# Altium footprint library SAMTEC SMD.PcbLib: 165 footprints (part 17 of 17) (continued)
## SAMTEC_TFM-125-02-L-D-A [mm] "50 Contacts - Pitch 1.27mm - Dual Row Straight SMT Header" (continued)
Mechanical 15:
  lines w0.05: -17.713,-3.425 17.713,-3.425 17.713,3.425 -17.713,3.425 -17.713,-3.425
3D body "SAMTEC_TFM-125-02-L-D-A.stp": height 5.59, standoff -1.14, extent -17.465,-2.984 17.465,2.985

## SAMTEC_TMM-103-01-L-D-SM-P-TR [mm] "6 Contacts - Pitch 2mm - Dual Row Surface Mount Straight Strip Header with Pick & Place Pad"
height 8.1
pads (6):
  rect 1.02x3.215 smd: 1(-2,-2.135) 2(-2,2.22) 3(0,-2.135) 4(0,2.22) 5(2,-2.135) 6(2,2.22)
Top Overlay:
  circle w0.25: c-1.998,-4.285 r0.125
  circle w0.25: c-1.998,-4.285 r0.125
  lines w0.2: -2.81,-1.65 -3,-1.65 -3,-0.412 -2.809,-0.412 -2.809,0.35 -3,0.35 -3,1.587 -2.81,1.587 ; -1.19,-1.65 -0.81,-1.65 ; -1.19,1.587 -0.81,1.587 ; 0.81,-1.65 1.19,-1.65 ; 0.81,1.587 1.19,1.587 ; 2.81,-1.65 3,-1.65 3,1.587 2.81,1.587
Mechanical 8:
  lines w0.1: -2.51,-3.743 -2.51,-0.528 ; -2.51,0.613 -2.51,3.828 ; -2.5,-2.135 -2,-2.135 ; -2.5,2.135 -2,2.135 ; -2,-2.635 -2,-2.135 ; -2,-1.635 -2,-2.135 ; -2,1.635 -2,2.135 ; -2,2.635 -2,2.135 ; -1.5,-2.135 -2,-2.135 ; -1.5,2.135 -2,2.135 ; -1.49,-3.743 -1.49,-0.528 ; -1.49,0.613 -1.49,3.828 ; -0.51,-3.743 -0.51,-0.528 ; -0.51,0.613 -0.51,3.828 ; -0.5,-2.135 0,-2.135 ; -0.5,0 0,0 ; -0.5,2.135 0,2.135 ; 0,-2.635 0,-2.135 ; 0,-1.635 0,-2.135 ; 0,-0.5 0,0 ; 0,0.5 0,0 ; 0,1.635 0,2.135 ; 0,2.635 0,2.135 ; 0.5,-2.135 0,-2.135 ; 0.5,0 0,0 ; 0.5,2.135 0,2.135 ; 0.51,-3.743 0.51,-0.528 ; 0.51,0.613 0.51,3.828 ; 1.49,-3.743 1.49,-0.528 ; 1.49,0.613 1.49,3.828 ; 1.5,-2.135 2,-2.135 ; 1.5,2.135 2,2.135 ; 2,-2.635 2,-2.135 ; 2,-1.635 2,-2.135 ; 2,1.635 2,2.135 ; 2,2.635 2,2.135 ; 2.5,-2.135 2,-2.135 ; 2.5,2.135 2,2.135 ; 2.51,-3.743 2.51,-0.528 ; 2.51,0.613 2.51,3.828 ; -2.51,-3.785 -1.49,-3.785 -1.49,-0.485 -2.51,-0.485 -2.51,-3.785 ; -2.51,0.485 -1.49,0.485 -1.49,3.785 -2.51,3.785 -2.51,0.485 ; -0.51,-3.785 0.51,-3.785 0.51,-0.485 -0.51,-0.485 -0.51,-3.785 ; -0.51,0.485 -0.51,3.785 0.51,3.785 0.51,0.485 -0.51,0.485 ; 1.49,-3.785 1.49,-0.485 2.51,-0.485 2.51,-3.785 1.49,-3.785 ; 1.49,0.485 1.49,3.785 2.51,3.785 2.51,0.485 1.49,0.485
Mechanical 14:
  circle w0.1: c-2,-4.285 r0.25
  lines w0.1: -2.254,-1.968 -2.254,-3.303 -1.746,-3.303 -1.746,-1.968 ; -2.254,1.968 -2.254,3.303 -1.746,3.303 -1.746,1.968 ; -0.254,-1.968 -0.254,-3.303 0.254,-3.303 0.254,-1.968 ; -0.254,1.968 -0.254,3.303 0.254,3.303 0.254,1.968 ; 1.746,-1.968 1.746,-3.303 2.254,-3.303 2.254,-1.968 ; 1.746,1.968 1.746,3.303 2.254,3.303 2.254,1.968 ; -2.254,-1.254 -2.254,-0.746 ; -2.254,-1.254 -1.746,-1.254 ; -2.254,-1.254 -2.127,-1.127 ; -2.254,-0.746 -2.127,-0.873 ; -2.254,-0.746 -1.746,-0.746 ; -2.254,0.746 -2.127,0.873 ; -2.254,0.746 -2.254,1.254 ; -2.254,0.746 -1.746,0.746 ; -2.254,1.254 -2.127,1.127 ; -2.254,1.254 -1.746,1.254 ; -2.127,-1.127 -2.127,-0.873 ; -2.127,-1.127 -1.873,-1.127 ; -2.127,-0.873 -1.873,-0.873 ; -2.127,0.873 -2.127,1.127 ; -2.127,0.873 -1.873,0.873 ; -2.127,1.127 -1.873,1.127 ; -1.873,-1.127 -1.746,-1.254 ; -1.873,-1.127 -1.873,-0.873 ; -1.873,-0.873 -1.746,-0.746 ; -1.873,0.873 -1.746,0.746 ; -1.873,0.873 -1.873,1.127 ; -1.873,1.127 -1.746,1.254 ; -1.746,-1.254 -1.746,-0.746 ; -1.746,0.746 -1.746,1.254 ; -0.254,-1.254 -0.254,-0.746 ; -0.254,-1.254 0.254,-1.254 ; -0.254,-1.254 -0.127,-1.127 ; -0.254,-0.746 -0.127,-0.873 ; -0.254,-0.746 0.254,-0.746 ; -0.254,0.746 -0.127,0.873 ; -0.254,0.746 -0.254,1.254 ; -0.254,0.746 0.254,0.746 ; -0.254,1.254 -0.127,1.127 ; -0.254,1.254 0.254,1.254 ; -0.127,-1.127 -0.127,-0.873 ; -0.127,-1.127 0.127,-1.127 ; -0.127,-0.873 0.127,-0.873 ; -0.127,0.873 -0.127,1.127 ; -0.127,0.873 0.127,0.873 ; -0.127,1.127 0.127,1.127 ; 0.127,-1.127 0.254,-1.254 ; 0.127,-1.127 0.127,-0.873 ; 0.127,-0.873 0.254,-0.746 ; 0.127,0.873 0.254,0.746 ; 0.127,0.873 0.127,1.127 ; 0.127,1.127 0.254,1.254 ; 0.254,-1.254 0.254,-0.746 ; 0.254,0.746 0.254,1.254 ; 1.746,-1.254 1.746,-0.746 ; 1.746,-1.254 2.254,-1.254 ; 1.746,-1.254 1.873,-1.127 ; 1.746,-0.746 1.873,-0.873 ; 1.746,-0.746 2.254,-0.746 ; 1.746,0.746 1.873,0.873 ; 1.746,0.746 1.746,1.254 ; 1.746,0.746 2.254,0.746 ; 1.746,1.254 1.873,1.127 ; 1.746,1.254 2.254,1.254 ; 1.873,-1.127 1.873,-0.873 ; 1.873,-1.127 2.127,-1.127 ; 1.873,-0.873 2.127,-0.873 ; 1.873,0.873 1.873,1.127 ; 1.873,0.873 2.127,0.873 ; 1.873,1.127 2.127,1.127 ; 2.127,-1.127 2.254,-1.254 ; 2.127,-1.127 2.127,-0.873 ; 2.127,-0.873 2.254,-0.746 ; 2.127,0.873 2.254,0.746 ; 2.127,0.873 2.127,1.127 ; 2.127,1.127 2.254,1.254 ; 2.254,-1.254 2.254,-0.746 ; 2.254,0.746 2.254,1.254 ; -3,-1.587 -3,1.65 -2.809,1.65 -2.809,1.968 -1.19,1.968 -1.19,1.65 -0.809,1.65 -0.809,1.968 0.809,1.968 0.809,1.65 1.19,1.65 1.19,1.968 2.809,1.968 2.809,1.65 3,1.65 3,0.412 2.809,0.412 2.809,-0.35 3,-0.35 3,-1.587 2.809,-1.587 2.809,-1.968 1.19,-1.968 1.19,-1.587 0.809,-1.587 0.809,-1.968 -0.809,-1.968 -0.809,-1.587 -1.19,-1.587 -1.19,-1.968 -2.809,-1.968 -2.809,-1.587 -3,-1.587
Mechanical 15:
  lines w0.1: -4.25,-4.035 -4.25,4.035 4.251,4.035 4.251,-4.035 -4.25,-4.035
3D body "SAMTEC_TMM-103-01-L-D-SM-P-TR_Part2.stp": height 8.1, standoff 2.76, extent -4,-2.54 4.001,2.54
3D body "SAMTEC_TMM-103-01-L-D-SM-P-TR_Part1.stp": height 5.97, standoff 0, extent -3,-3.302 3,3.303

## SAMTEC_TMM-103-01-L-D-SM-TR [mm] "6 Contacts - Pitch 2mm - Dual Row Surface Mount Straight Strip Header"
height 5.97
pads (6):
  rect 1.02x3.215 smd: 1(-2,-2.135) 2(-2,2.22) 3(0,-2.135) 4(0,2.22) 5(2,-2.135) 6(2,2.22)
Top Overlay:
  circle w0.25: c-1.998,-4.285 r0.125
  circle w0.25: c-1.998,-4.285 r0.125
  lines w0.2: -2.81,-1.65 -3,-1.65 -3,-0.412 -2.809,-0.412 -2.809,0.35 -3,0.35 -3,1.587 -2.81,1.587 ; -1.19,-1.65 -0.81,-1.65 ; -1.19,1.587 -0.81,1.587 ; 0.81,-1.65 1.19,-1.65 ; 0.81,1.587 1.19,1.587 ; 2.81,-1.65 3,-1.65 3,1.587 2.81,1.587
Mechanical 8:
  lines w0.1: -2.51,-3.743 -2.51,-0.528 ; -2.51,0.613 -2.51,3.828 ; -2.5,-2.135 -2,-2.135 ; -2.5,2.135 -2,2.135 ; -2,-2.635 -2,-2.135 ; -2,-1.635 -2,-2.135 ; -2,1.635 -2,2.135 ; -2,2.635 -2,2.135 ; -1.5,-2.135 -2,-2.135 ; -1.5,2.135 -2,2.135 ; -1.49,-3.743 -1.49,-0.528 ; -1.49,0.613 -1.49,3.828 ; -0.51,-3.743 -0.51,-0.528 ; -0.51,0.613 -0.51,3.828 ; -0.5,-2.135 0,-2.135 ; -0.5,0 0,0 ; -0.5,2.135 0,2.135 ; 0,-2.635 0,-2.135 ; 0,-1.635 0,-2.135 ; 0,-0.5 0,0 ; 0,0.5 0,0 ; 0,1.635 0,2.135 ; 0,2.635 0,2.135 ; 0.5,-2.135 0,-2.135 ; 0.5,0 0,0 ; 0.5,2.135 0,2.135 ; 0.51,-3.743 0.51,-0.528 ; 0.51,0.613 0.51,3.828 ; 1.49,-3.743 1.49,-0.528 ; 1.49,0.613 1.49,3.828 ; 1.5,-2.135 2,-2.135 ; 1.5,2.135 2,2.135 ; 2,-2.635 2,-2.135 ; 2,-1.635 2,-2.135 ; 2,1.635 2,2.135 ; 2,2.635 2,2.135 ; 2.5,-2.135 2,-2.135 ; 2.5,2.135 2,2.135 ; 2.51,-3.743 2.51,-0.528 ; 2.51,0.613 2.51,3.828 ; -2.51,-3.785 -1.49,-3.785 -1.49,-0.485 -2.51,-0.485 -2.51,-3.785 ; -2.51,0.485 -1.49,0.485 -1.49,3.785 -2.51,3.785 -2.51,0.485 ; -0.51,-3.785 0.51,-3.785 0.51,-0.485 -0.51,-0.485 -0.51,-3.785 ; -0.51,0.485 -0.51,3.785 0.51,3.785 0.51,0.485 -0.51,0.485 ; 1.49,-3.785 1.49,-0.485 2.51,-0.485 2.51,-3.785 1.49,-3.785 ; 1.49,0.485 1.49,3.785 2.51,3.785 2.51,0.485 1.49,0.485
Mechanical 14:
  circle w0.1: c-2,-4.285 r0.25
  lines w0.1: -2.254,-1.968 -2.254,-3.303 -1.746,-3.303 -1.746,-1.968 ; -2.254,1.968 -2.254,3.303 -1.746,3.303 -1.746,1.968 ; -0.254,-1.968 -0.254,-3.303 0.254,-3.303 0.254,-1.968 ; -0.254,1.968 -0.254,3.303 0.254,3.303 0.254,1.968 ; 1.746,-1.968 1.746,-3.303 2.254,-3.303 2.254,-1.968 ; 1.746,1.968 1.746,3.303 2.254,3.303 2.254,1.968 ; -2.254,-1.254 -2.254,-0.746 ; -2.254,-1.254 -1.746,-1.254 ; -2.254,-1.254 -2.127,-1.127 ; -2.254,-0.746 -2.127,-0.873 ; -2.254,-0.746 -1.746,-0.746 ; -2.254,0.746 -2.127,0.873 ; -2.254,0.746 -2.254,1.254 ; -2.254,0.746 -1.746,0.746 ; -2.254,1.254 -2.127,1.127 ; -2.254,1.254 -1.746,1.254 ; -2.127,-1.127 -2.127,-0.873 ; -2.127,-1.127 -1.873,-1.127 ; -2.127,-0.873 -1.873,-0.873 ; -2.127,0.873 -2.127,1.127 ; -2.127,0.873 -1.873,0.873 ; -2.127,1.127 -1.873,1.127 ; -1.873,-1.127 -1.746,-1.254 ; -1.873,-1.127 -1.873,-0.873 ; -1.873,-0.873 -1.746,-0.746 ; -1.873,0.873 -1.746,0.746 ; -1.873,0.873 -1.873,1.127 ; -1.873,1.127 -1.746,1.254 ; -1.746,-1.254 -1.746,-0.746 ; -1.746,0.746 -1.746,1.254 ; -0.254,-1.254 -0.254,-0.746 ; -0.254,-1.254 0.254,-1.254 ; -0.254,-1.254 -0.127,-1.127 ; -0.254,-0.746 -0.127,-0.873 ; -0.254,-0.746 0.254,-0.746 ; -0.254,0.746 -0.127,0.873 ; -0.254,0.746 -0.254,1.254 ; -0.254,0.746 0.254,0.746 ; -0.254,1.254 -0.127,1.127 ; -0.254,1.254 0.254,1.254 ; -0.127,-1.127 -0.127,-0.873 ; -0.127,-1.127 0.127,-1.127 ; -0.127,-0.873 0.127,-0.873 ; -0.127,0.873 -0.127,1.127 ; -0.127,0.873 0.127,0.873 ; -0.127,1.127 0.127,1.127 ; 0.127,-1.127 0.254,-1.254 ; 0.127,-1.127 0.127,-0.873 ; 0.127,-0.873 0.254,-0.746 ; 0.127,0.873 0.254,0.746 ; 0.127,0.873 0.127,1.127 ; 0.127,1.127 0.254,1.254 ; 0.254,-1.254 0.254,-0.746 ; 0.254,0.746 0.254,1.254 ; 1.746,-1.254 1.746,-0.746 ; 1.746,-1.254 2.254,-1.254 ; 1.746,-1.254 1.873,-1.127 ; 1.746,-0.746 1.873,-0.873 ; 1.746,-0.746 2.254,-0.746 ; 1.746,0.746 1.873,0.873 ; 1.746,0.746 1.746,1.254 ; 1.746,0.746 2.254,0.746 ; 1.746,1.254 1.873,1.127 ; 1.746,1.254 2.254,1.254 ; 1.873,-1.127 1.873,-0.873 ; 1.873,-1.127 2.127,-1.127 ; 1.873,-0.873 2.127,-0.873 ; 1.873,0.873 1.873,1.127 ; 1.873,0.873 2.127,0.873 ; 1.873,1.127 2.127,1.127 ; 2.127,-1.127 2.254,-1.254 ; 2.127,-1.127 2.127,-0.873 ; 2.127,-0.873 2.254,-0.746 ; 2.127,0.873 2.254,0.746 ; 2.127,0.873 2.127,1.127 ; 2.127,1.127 2.254,1.254 ; 2.254,-1.254 2.254,-0.746 ; 2.254,0.746 2.254,1.254 ; -3,-1.587 -3,1.65 -2.809,1.65 -2.809,1.968 -1.19,1.968 -1.19,1.65 -0.809,1.65 -0.809,1.968 0.809,1.968 0.809,1.65 1.19,1.65 1.19,1.968 2.809,1.968 2.809,1.65 3,1.65 3,0.412 2.809,0.412 2.809,-0.35 3,-0.35 3,-1.587 2.809,-1.587 2.809,-1.968 1.19,-1.968 1.19,-1.587 0.809,-1.587 0.809,-1.968 -0.809,-1.968 -0.809,-1.587 -1.19,-1.587 -1.19,-1.968 -2.809,-1.968 -2.809,-1.587 -3,-1.587
Mechanical 15:
  lines w0.05: -3.25,-4.035 -3.25,4.035 3.25,4.035 3.25,-4.035 -3.25,-4.035
3D body "SAMTEC_TMM-103-01-L-D-SM-TR.stp": height 5.97, standoff 0, extent -3,-3.302 3,3.303

## SAMTEC_TMM-110-01-G-D-SM-A [mm] "20 Contacts - Pitch 2mm - Dual Row Surface Mount Straight Strip Header With Alignment Pin"
height 5.97
pads (22):
  rect 1.02x3.215 smd: 1(-9,-2.178) 2(-9,2.178) 3(-7,-2.178) 4(-7,2.178) 5(-5,-2.178) 6(-5,2.178) 7(-3,-2.178) 8(-3,2.178) 9(-1,-2.178) 10(-1,2.178) 11(1,-2.178) 12(1,2.178) 13(3,-2.178) 14(3,2.178) 15(5,-2.178) 16(5,2.178) 17(7,-2.178) 18(7,2.178) 19(9,-2.178) 20(9,2.178)
  round 0.5 hole 1.2 unplated mask+0.35: 21(-8,0) 22(8,0)
Top Overlay:
  circle w0.25: c-8.998,-4.327 r0.125
  circle w0.25: c-8.998,-4.327 r0.125
  lines w0.2: -10,-1.969 -10,1.969 ; 10,-1.969 10,1.969
  text "20" at 10.95,2.453 h1
Mechanical 8:
  drawing of 172 lines, arcs and shapes, not listed
Mechanical 14:
  drawing of 379 lines, arcs and shapes, not listed
  text "20" at 10.95,2.453 h1
Mechanical 15:
  lines w0.1: -10.25,-4.035 -10.25,4.035 10.25,4.035 10.25,-4.035 -10.25,-4.035
3D body "SAMTEC_TMM-110-01-G-D-SM-A.stp": height 5.97, standoff -1.02, extent -10,-3.274 10,3.274

## SAMTEC_TMM-110-01-L-D-SM-A [mm] "20 Contacts - Pitch 2mm - Dual Row Surface Mount Straight Strip Header With Alignment Pin"
height 5.97
pads (22):
  rect 1.02x3.215 smd: 1(-9,-2.178) 2(-9,2.178) 3(-7,-2.178) 4(-7,2.178) 5(-5,-2.178) 6(-5,2.178) 7(-3,-2.178) 8(-3,2.178) 9(-1,-2.178) 10(-1,2.178) 11(1,-2.178) 12(1,2.178) 13(3,-2.178) 14(3,2.178) 15(5,-2.178) 16(5,2.178) 17(7,-2.178) 18(7,2.178) 19(9,-2.178) 20(9,2.178)
  round 0.5 hole 1.2 unplated mask+0.35: 21(-8,0) 22(8,0)
Top Overlay:
  circle w0.25: c-8.998,-4.327 r0.125
  circle w0.25: c-8.998,-4.327 r0.125
  lines w0.2: -10,-1.969 -10,1.969 ; 10,-1.969 10,1.969
  text "20" at 10.95,2.453 h1
Mechanical 8:
  drawing of 172 lines, arcs and shapes, not listed
Mechanical 14:
  drawing of 379 lines, arcs and shapes, not listed
  text "20" at 10.95,2.453 h1
Mechanical 15:
  lines w0.1: -10.25,-4.035 10.25,-4.035 10.25,4.035 -10.25,4.035 -10.25,-4.035
3D body "SAMTEC_TMM-110-01-L-D-SM-A.stp": height 5.97, standoff -1.02, extent -10,-3.274 10,3.274

## SAMTEC_TMM-112-01-L-D-SM-A [mm] "24 Contacts - Pitch 2mm - Top Entry, Dual Row Surface Mount Header"
height 5.97
pads (26):
  rect 1x3.3 smd: 1(-11,-2.178) 2(-11,2.123) 3(-9,-2.178) 4(-9,2.123) 5(-7,-2.178) 6(-7,2.123) 7(-5,-2.178) 8(-5,2.123) 9(-3,-2.178) 10(-3,2.123) 11(-1,-2.178) 12(-1,2.123) 13(1,-2.178) 14(1,2.123) 15(3,-2.178) 16(3,2.123) 17(5,-2.178) 18(5,2.123) 19(7,-2.178) 20(7,2.123) 21(9,-2.178) 22(9,2.123) 23(11,-2.178) 24(11,2.123)
  round 0.5 hole 1.2 unplated mask+0.35: 25(-10,0) 26(10,0)
Top Overlay:
  circle w0.25: c-10.998,-4.327 r0.125
  circle w0.25: c-10.998,-4.327 r0.125
  lines w0.2: -11.8,-1.996 -12,-1.996 -12,1.941 -11.8,1.941 ; 11.8,-1.996 12,-1.996 12,1.941 11.8,1.941
  text "24" at 12.9,2.173 h1
Mechanical 8:
  drawing of 300 lines, arcs and shapes, not listed
Mechanical 14:
  drawing of 455 lines, arcs and shapes, not listed
  text "24" at 12.9,2.173 h1
Mechanical 15:
  lines w0.1: -12.25,-4.035 -12.25,4.035 12.25,4.035 12.25,-4.035 -12.25,-4.035
3D body "SAMTEC_TMM-112-01-G-D-SM-A.stp": height 5.97, standoff -1.02, extent -12,-3.274 12,3.274

## SAMTEC_TMM-120-01-L-D-SM [mm] "40 Contacts - Pitch 2mm - Top Entry, Dual Row Surface Mount Header"
height 5.97
pads (40):
  rect 1x3.3 smd: 1(-19,-2.15) 2(-19,2.15) 3(-17,-2.15) 4(-17,2.15) 5(-15,-2.15) 6(-15,2.15) 7(-13,-2.15) 8(-13,2.15) 9(-11,-2.15) 10(-11,2.15) 11(-9,-2.15) 12(-9,2.15) 13(-7,-2.15) 14(-7,2.15) 15(-5,-2.15) 16(-5,2.15) 17(-3,-2.15) 18(-3,2.15) 19(-1,-2.15) 20(-1,2.15) 21(1,-2.15) 22(1,2.15) 23(3,-2.15) 24(3,2.15) 25(5,-2.15) 26(5,2.15) 27(7,-2.15) 28(7,2.15) 29(9,-2.15) 30(9,2.15) 31(11,-2.15) 32(11,2.15) 33(13,-2.15) 34(13,2.15) 35(15,-2.15) 36(15,2.15) 37(17,-2.15) 38(17,2.15) 39(19,-2.15) 40(19,2.15)
Top Overlay:
  circle w0.25: c-18.998,-4.3 r0.125
  circle w0.25: c-18.998,-4.3 r0.125
  lines w0.2: -19.8,-1.969 -20,-1.969 -20,1.969 -19.8,1.969 ; 19.8,-1.969 20,-1.969 20,1.969 19.8,1.969
  text "40" at 20.9,2.2 h1
Mechanical 8:
  drawing of 324 lines, arcs and shapes, not listed
Mechanical 14:
  drawing of 637 lines, arcs and shapes, not listed
  text "40" at 20.9,2.2 h1
Mechanical 15:
  lines w0.1: -20.25,-4.05 -20.25,4.05 20.25,4.05 20.25,-4.05 -20.25,-4.05
3D body "SAMTEC_TMM-120-01-L-D-SM.stp": height 5.97, standoff 0, extent -20,-3.275 20,3.275

## SAMTEC_UCC8-010-1-H-S-1-A [mm] "10 Contacts - Pitch 0.8mm - Rugged Micro Flyover Socket System"
height 3.95
pads (14):
  rect 0.5x1.14 smd: 1(-3.6,0.094) 2(-2.8,0.094) 3(-2,0.094) 4(-1.2,0.094) 5(-0.4,0.094) 6(0.4,0.094) 7(1.2,0.094) 8(2,0.094) 9(2.8,0.094) 10(3.6,0.094)
  round 1.4 hole 1.15: 11(-5,3.104) 12(5,3.104)
  round 0.5 hole 0.9 unplated mask+0.2: 13(-4.725,1.654) 14(4.725,1.654)
Top Layer:
  region: 3.9,2.394 3.9,3.464 4.25,3.814 5.7,3.814 5.7,2.394
  region: -5.7,2.394 -5.7,3.814 -4.25,3.814 -3.9,3.464 -3.9,2.394
Top Overlay:
  circle w0.25: c-4.575,-0.05 r0.125
  circle w0.25: c-4.575,-0.05 r0.125
  lines w0.2: -5.625,2.094 -5.625,1.604 -5.336,1.104 ; -5.625,4.114 -5.625,4.604 5.625,4.604 ; -4.625,0.9 -4.625,0.704 -4.15,0.704 ; -3.975,4.604 -3.6,3.854 -3.225,4.604 ; -3.792,0.964 -3.79,0.968 -3.79,2.094 ; -3.726,2.094 -3.7,1.328 ccw(c-3.626,1.338) -3.631,1.263 -3.569,1.263 ccw(c-3.574,1.338) -3.5,1.328 -3.436,3.185 -3.6,3.185 ; -3.6,3.449 -3.41,3.449 -3.408,0.964 ; -2.992,0.964 -2.99,3.449 -2.61,3.449 -2.61,0.968 -2.608,0.964 ; -2.192,0.964 -2.19,3.449 -1.81,3.449 -1.81,0.968 -1.808,0.964 ; -1.392,0.964 -1.39,3.449 -1.01,3.449 -1.01,0.968 -1.008,0.964 ; -0.592,0.964 -0.59,3.449 -0.21,3.449 -0.21,0.968 -0.208,0.964 ; 0.208,0.964 0.21,3.449 0.59,3.449 0.59,0.968 0.592,0.964 ; 1.008,0.964 1.01,3.449 1.39,3.449 1.39,0.968 1.392,0.964 ; 1.808,0.964 1.81,3.449 2.19,3.449 2.19,0.968 2.192,0.964 ; 2.608,0.964 2.61,3.449 2.99,3.449 2.99,0.968 2.992,0.964 ; 3.408,0.964 3.41,3.449 3.6,3.449 ; 3.6,3.185 3.436,3.185 3.5,1.328 ccw(c3.574,1.338) 3.569,1.263 3.631,1.263 ccw(c3.626,1.338) 3.7,1.328 3.726,2.094 ; 3.79,2.094 3.79,0.968 3.792,0.964 ; 4.05,4.039 4.05,4.354 cw(c4.3,4.354) 4.3,4.604 ; 4.15,0.704 4.625,0.704 4.625,0.9 ; 5.336,1.104 5.625,1.604 ; 5.625,1.604 5.625,2.094 5.625,1.604 ; 5.625,4.604 5.625,4.114 5.625,4.604 ; -2.964,3.191 -2.636,3.191 -2.7,1.334 cw(c-2.774,1.344) -2.769,1.269 -2.831,1.269 cw(c-2.826,1.344) -2.9,1.334 -2.964,3.191 ; -2.164,3.19 -1.836,3.19 -1.9,1.333 cw(c-1.974,1.343) -1.969,1.268 -2.031,1.268 cw(c-2.026,1.343) -2.1,1.333 -2.164,3.19 ; -1.364,3.189 -1.036,3.189 -1.1,1.333 cw(c-1.174,1.342) -1.169,1.268 -1.231,1.268 cw(c-1.226,1.342) -1.3,1.333 -1.364,3.189 ; -0.564,3.188 -0.236,3.188 -0.3,1.332 cw(c-0.374,1.341) -0.369,1.267 -0.431,1.267 cw(c-0.426,1.341) -0.5,1.332 -0.564,3.188 ; 0.236,3.188 0.564,3.188 0.5,1.331 cw(c0.426,1.341) 0.431,1.266 0.369,1.266 cw(c0.374,1.341) 0.3,1.331 0.236,3.188 ; 1.036,3.187 1.364,3.187 1.3,1.33 cw(c1.226,1.34) 1.231,1.265 1.169,1.265 cw(c1.174,1.34) 1.1,1.33 1.036,3.187 ; 1.836,3.186 2.164,3.186 2.1,1.33 cw(c2.026,1.339) 2.031,1.265 1.969,1.265 cw(c1.974,1.339) 1.9,1.33 1.836,3.186 ; 2.636,3.186 2.964,3.186 2.9,1.329 cw(c2.826,1.338) 2.831,1.264 2.769,1.264 cw(c2.774,1.338) 2.7,1.329 2.636,3.186
Mechanical 8:
  circle w0.1: c4.725,1.654 r0.45
  circle w0.1: c5,3.104 r0.575
  circle w0.1: c-5,3.104 r0.575
  circle w0.1: c-4.725,1.654 r0.45
  lines w0.1: -5.5,3.104 -5,3.104 ; -5.225,1.654 -4.725,1.654 ; -5,2.604 -5,3.104 ; -5,3.604 -5,3.104 ; -4.725,1.154 -4.725,1.654 ; -4.725,2.154 -4.725,1.654 ; -4.5,3.104 -5,3.104 ; -4.225,1.654 -4.725,1.654 ; -0.5,0 0,0 ; 0,-0.5 0,0 ; 0,0.5 0,0 ; 0.5,0 0,0 ; 4.225,1.654 4.725,1.654 ; 4.5,3.104 5,3.104 ; 4.725,1.154 4.725,1.654 ; 4.725,2.154 4.725,1.654 ; 5,2.604 5,3.104 ; 5,3.604 5,3.104 ; 5.225,1.654 4.725,1.654 ; 5.5,3.104 5,3.104 ; -3.85,0.664 -3.35,0.664 ; -3.85,0.664 -3.85,-0.476 -3.35,-0.476 -3.35,0.664 ; -3.85,0.664 -3.6,0.094 -3.35,0.664 ; -3.05,0.664 -2.55,0.664 ; -3.05,0.664 -3.05,-0.476 -2.55,-0.476 -2.55,0.664 ; -3.05,0.664 -2.8,0.094 -2.55,0.664 ; -2.25,0.664 -1.75,0.664 ; -2.25,0.664 -2.25,-0.476 -1.75,-0.476 -1.75,0.664 ; -2.25,0.664 -2,0.094 -1.75,0.664 ; -1.45,0.664 -0.95,0.664 ; -1.45,0.664 -1.45,-0.476 -0.95,-0.476 -0.95,0.664 ; -1.45,0.664 -1.2,0.094 -0.95,0.664 ; -0.65,0.664 -0.15,0.664 ; -0.65,0.664 -0.65,-0.476 -0.15,-0.476 -0.15,0.664 ; -0.65,0.664 -0.4,0.094 -0.15,0.664 ; 0.15,0.664 0.65,0.664 ; 0.15,0.664 0.15,-0.476 0.65,-0.476 0.65,0.664 ; 0.15,0.664 0.4,0.094 0.65,0.664 ; 0.95,0.664 1.45,0.664 ; 0.95,0.664 0.95,-0.476 1.45,-0.476 1.45,0.664 ; 0.95,0.664 1.2,0.094 1.45,0.664 ; 1.75,0.664 2.25,0.664 ; 1.75,0.664 1.75,-0.476 2.25,-0.476 2.25,0.664 ; 1.75,0.664 2,0.094 2.25,0.664 ; 2.55,0.664 3.05,0.664 ; 2.55,0.664 2.55,-0.476 3.05,-0.476 3.05,0.664 ; 2.55,0.664 2.8,0.094 3.05,0.664 ; 3.35,0.664 3.85,0.664 ; 3.35,0.664 3.35,-0.476 3.85,-0.476 3.85,0.664 ; 3.35,0.664 3.6,0.094 3.85,0.664 ; -5.7,2.394 -5.7,3.814 -4.25,3.814 -3.9,3.464 -3.9,2.394 -5.7,2.394 ; 3.9,2.394 5.7,2.394 5.7,3.814 4.25,3.814 3.9,3.464 3.9,2.394
Mechanical 14:
  drawing of 347 lines, arcs and shapes, not listed
Mechanical 15:
  lines w0.05: -5.875,1.553 -5.483,0.854 -4.875,0.854 -4.875,0.454 -4.1,0.454 -4.1,-0.726 4.1,-0.726 4.1,0.454 4.875,0.454 4.875,0.854 5.481,0.854 5.875,1.537 5.875,4.854 -5.875,4.854 -5.875,1.553
3D body "SAMTEC_UCC8-010-1-H-S-1-A.stp": height 3.95, standoff -1.4, extent -5.7,-0.354 5.625,4.605

## SAMTEC_UEC5-019-1-H-D-RA-1-A [mm] "38 Contacts, Pitch 0.5mm, Rugged Micro Flyover Socket System"
height 3.31
pads (42):
  round 1 hole 0.75: 39(-5.225,-3.68) 40(5.225,-3.68)
  round 0.5 hole 0.9 unplated mask+0.2: 41(-4.725,-2.2) 42(4.725,-2.2)
  rect 0.3x0.85 smd: A1(-4.615,0.625) A2(-4.115,0.625) A3(-3.615,0.625) A4(-3.115,0.625) A5(-2.615,0.625) A6(-2.115,0.625) A7(-1.615,0.625) A8(-1.115,0.625) A9(-0.615,0.625) A10(-0.115,0.625) A11(0.385,0.625) A12(0.885,0.625) A13(1.385,0.625) A14(1.885,0.625) A15(2.385,0.625) A16(2.885,0.625) A17(3.385,0.625) A18(3.885,0.625) A19(4.385,0.625) B1(-4.385,-0.625) B2(-3.885,-0.625) B3(-3.385,-0.625) B4(-2.885,-0.625) B5(-2.385,-0.625) B6(-1.885,-0.625) B7(-1.385,-0.625) B8(-0.885,-0.625) B9(-0.385,-0.625) B10(0.115,-0.625) B11(0.615,-0.625) B12(1.115,-0.625) B13(1.615,-0.625) B14(2.115,-0.625) B15(2.615,-0.625) B16(3.115,-0.625) B17(3.615,-0.625) B18(4.115,-0.625) B19(4.615,-0.625)
Top Layer:
  region: -5.725,-3.68 -5.725,-2.53 -5.226,-2.53 -5.182,-2.589 -5.072,-2.689 -4.942,-2.759 -4.799,-2.795 -4.725,-2.8 -4.725,-3.68 -4.725,-3.779 -4.801,-3.963 -4.942,-4.104 -5.126,-4.18 -5.324,-4.18 -5.508,-4.104 -5.649,-3.963 -5.725,-3.779
  region: 4.725,-3.68 4.725,-2.8 4.799,-2.795 4.942,-2.759 5.073,-2.689 5.182,-2.589 5.226,-2.53 5.725,-2.53 5.725,-3.68 5.725,-3.779 5.649,-3.963 5.508,-4.104 5.325,-4.18 5.126,-4.18 4.942,-4.104 4.801,-3.963 4.725,-3.779
Top Overlay:
  circle w0.25: c-5.875,0.675 r0.125
  circle w0.25: c-5.875,0.675 r0.125
  lines w0.2: -5.626,-4.5 -5.626,-4.988 5.626,-4.988 5.626,-4.5 ; -5.626,-2.23 -5.626,-1.213 -5.326,-1.213 ; -5.476,-4.988 -5.247,-4.53 ; -5.326,-1.7 -5.326,-0.413 -5.126,-0.413 ; -5.126,-1.5 -5.126,0.512 ; -4.905,-4.63 -4.726,-4.988 ; -4.861,-4.393 -4.861,-4.6 4.859,-4.6 4.859,-4.474 ; -4.641,-4.603 -4.641,-4.3 ; -4.361,-4.988 -4.361,-5.738 4.359,-5.738 4.359,-4.988 ; -4.361,-4.6 -4.361,-3.403 ; -4.141,-4.988 -4.141,-5.487 -3.861,-5.487 -3.861,-4.988 ; -4.141,-4.6 -4.141,-3.403 -3.861,-3.403 -3.861,-4.6 ; -4.086,-4.311 -3.916,-4.311 ; -3.641,-4.988 -3.641,-5.487 -3.361,-5.487 -3.361,-4.988 ; -3.641,-4.6 -3.641,-3.403 -3.361,-3.403 -3.361,-4.6 ; -3.586,-4.311 -3.416,-4.311 ; -3.141,-4.988 -3.141,-5.487 -2.861,-5.487 -2.861,-4.988 ; -3.141,-4.6 -3.141,-3.403 -2.861,-3.403 -2.861,-4.6 ; -3.086,-4.311 -2.916,-4.311 ; -2.641,-4.6 -2.641,-3.403 -2.361,-3.403 -2.361,-4.6 ; -2.586,-4.311 -2.416,-4.311 ; -2.141,-4.6 -2.141,-3.403 -1.861,-3.403 -1.861,-4.6 ; -2.086,-4.311 -1.916,-4.311 ; -1.641,-4.6 -1.641,-3.403 -1.361,-3.403 -1.361,-4.6 ; -1.586,-4.311 -1.416,-4.311 ; -1.141,-4.6 -1.141,-3.403 -0.861,-3.403 -0.861,-4.6 ; -1.086,-4.311 -0.916,-4.311 ; -0.641,-4.6 -0.641,-3.403 -0.361,-3.403 -0.361,-4.6 ; -0.586,-4.311 -0.416,-4.311 ; -0.141,-4.6 -0.141,-3.403 0.139,-3.403 0.139,-4.6 ; -0.086,-4.311 0.084,-4.311 ; 0.359,-4.6 0.359,-3.403 0.639,-3.403 0.639,-4.6 ; 0.414,-4.311 0.584,-4.311 ; 0.859,-4.6 0.859,-3.403 1.139,-3.403 1.139,-4.6 ; 0.914,-4.311 1.084,-4.311 ; 1.359,-4.6 1.359,-3.403 1.639,-3.403 1.639,-4.6 ; 1.414,-4.311 1.584,-4.311 ; 1.859,-4.6 1.859,-3.403 2.139,-3.403 2.139,-4.6 ; 1.914,-4.311 2.084,-4.311 ; 2.359,-4.6 2.359,-3.403 2.639,-3.403 2.639,-4.6 ; 2.414,-4.311 2.584,-4.311 ; 2.859,-4.988 2.859,-5.487 3.139,-5.487 3.139,-4.988 ; 2.859,-4.6 2.859,-3.403 3.139,-3.403 3.139,-4.6 ; 2.914,-4.311 3.084,-4.311 ; 3.359,-4.988 3.359,-5.487 3.639,-5.487 3.639,-4.988 ; 3.359,-4.6 3.359,-3.403 3.639,-3.403 3.639,-4.6 ; 3.414,-4.311 3.584,-4.311 ; 3.859,-4.988 3.859,-5.487 4.139,-5.487 4.139,-4.988 ; 3.859,-4.6 3.859,-3.403 4.139,-3.403 4.139,-4.6 ; 3.914,-4.311 4.084,-4.311 ; 4.359,-4.6 4.359,-3.403 4.425,-3.403 ; 4.639,-4.603 4.639,-4.3 ; 4.835,0.662 4.976,0.662 5.126,0.512 5.126,-1.5 ; 5.126,-0.413 5.326,-0.413 5.326,-1.7 ; 5.326,-1.213 5.626,-1.213 5.626,-2.23
Mechanical 8:
  drawing of 263 lines, arcs and shapes, not listed
Mechanical 14:
  drawing of 499 lines, arcs and shapes, not listed
Mechanical 15:
  lines w0.05: -5.875,-5.25 -5.875,-0.163 -5.376,-0.163 -5.376,1.3 5.376,1.3 5.376,-0.163 5.875,-0.163 5.875,-5.25 4.61,-5.25 4.61,-6 -4.61,-6 -4.61,-5.25 -5.875,-5.25
3D body "SAMTEC_UEC5-019-1-H-D-RA-1-A.stp": height 3.31, standoff -1.4, extent -5.626,-5.738 5.626,0.912